# Altium integrated library Weidmueller_OMNIMATE_Signal.IntLib: 2550 symbols (part 4 of 45)
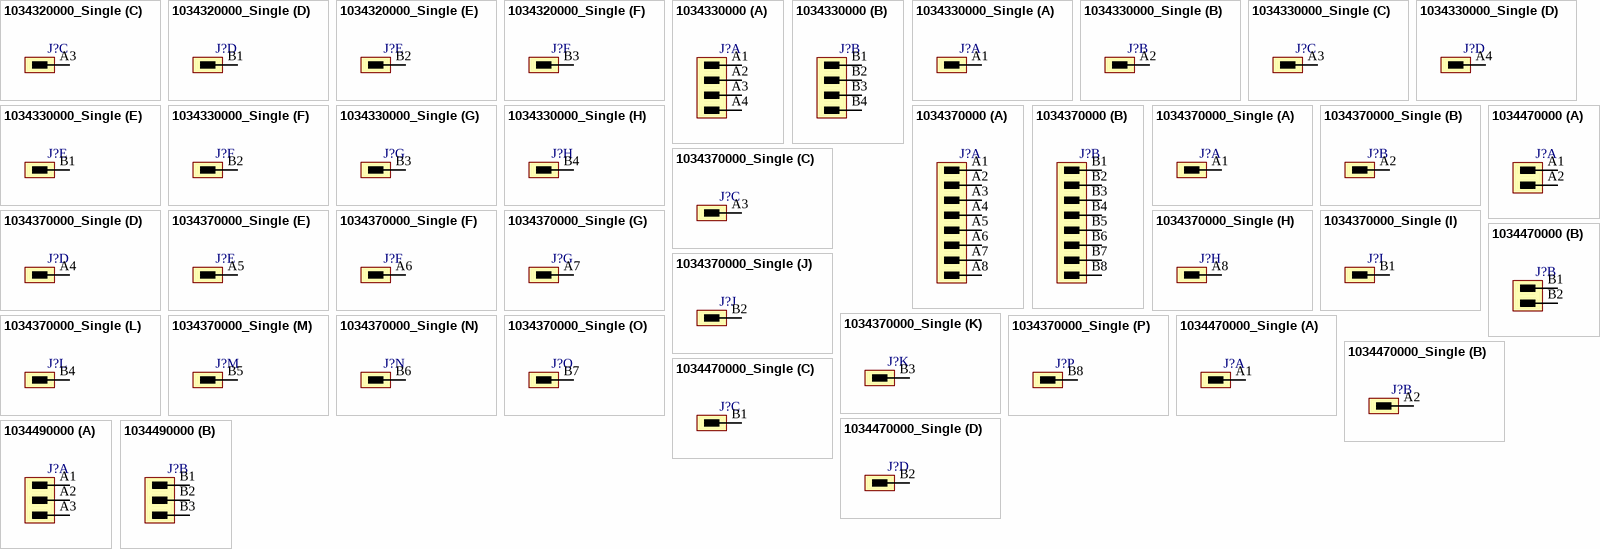
[diagram p214: symbols 1034320000_Single to 1034490000]

## 1034330000_Single
designator J?
OMNIMATE Signal - series BC/SC 3.81; PartNumber: 1034330000; Manufacturer: Weidmueller; Short_text_for_material: SCDV-THR 3.81/08/90F 1.5SN BK BX; Side_termination_characteristic: Flange; Mounting_onto_the_PCB: Reflow solder connection; Pitch_mm: 3.81 mm; Pitch_inch: 0.15 inch; No_of_poles: 8; Outgoing_elbow: 90°; Solder_pin_length_mm: 1.5 mm; Contact_surface: tinned; Insulating_material: LCP GF; UL_94_flammability_rating: V-0; Rated_voltage_for_surge_voltage_class_pollution_degree_II_2: 320 V; Rated_current_min_no_of_poles_TU_20_deg_C: 17.5 A; Rated_voltage_use_group_B_UL_1059: 300 V; Rated_current_use_group_B_UL_1059: 10 A; PackageReference: SCDV_THR_3_81_90F_08; Colour: Black; Packaging: Box; Qty: 50 PCS; Revision: V1; ComponentLink1Description: Manufacturer URL; ComponentLink1URL: http://www.weidmueller.com/; ComponentLink2Description: URL Link1; ComponentLink2URL: http://catalog.weidmueller.com/catalog/Start.do?localeId=en&ObjectID=1034330000
footprint SCDV_THR_3_81_90F_08 (OMNIMATE Signal - Serie BC/SC 3.81  SCDV-THR 3.81/08/90F 3.2)
part A pins: A1
part B pins: A2
part C pins: A3
part D pins: A4
part E pins: B1
part F pins: B2
part G pins: B3
part H pins: B4

## 1034370000
designator J?
OMNIMATE Signal - series BC/SC 3.81; PartNumber: 1034370000; Manufacturer: Weidmueller; Short_text_for_material: SCDV-THR 3.81/16/90F 1.5SN BK BX; Side_termination_characteristic: Flange; Mounting_onto_the_PCB: Reflow solder connection; Pitch_mm: 3.81 mm; Pitch_inch: 0.15 inch; No_of_poles: 16; Outgoing_elbow: 90°; Solder_pin_length_mm: 1.5 mm; Contact_surface: tinned; Insulating_material: LCP GF; UL_94_flammability_rating: V-0; Rated_voltage_for_surge_voltage_class_pollution_degree_II_2: 320 V; Rated_current_min_no_of_poles_TU_20_deg_C: 17.5 A; Rated_voltage_use_group_B_UL_1059: 300 V; Rated_current_use_group_B_UL_1059: 10 A; PackageReference: SCDV_THR_3_81_90F_16; Colour: Black; Packaging: Box; Qty: 50 PCS; Revision: V1; ComponentLink1Description: Manufacturer URL; ComponentLink1URL: http://www.weidmueller.com/; ComponentLink2Description: URL Link1; ComponentLink2URL: http://catalog.weidmueller.com/catalog/Start.do?localeId=en&ObjectID=1034370000
footprint SCDV_THR_3_81_90F_16 (OMNIMATE Signal - Serie BC/SC 3.81  SCDV-THR 3.81/16/90F 3.2)
part A pins: A1, A2, A3, A4, A5, A6, A7, A8
part B pins: B1, B2, B3, B4, B5, B6, B7, B8

## 1034370000_Single
designator J?
OMNIMATE Signal - series BC/SC 3.81; PartNumber: 1034370000; Manufacturer: Weidmueller; Short_text_for_material: SCDV-THR 3.81/16/90F 1.5SN BK BX; Side_termination_characteristic: Flange; Mounting_onto_the_PCB: Reflow solder connection; Pitch_mm: 3.81 mm; Pitch_inch: 0.15 inch; No_of_poles: 16; Outgoing_elbow: 90°; Solder_pin_length_mm: 1.5 mm; Contact_surface: tinned; Insulating_material: LCP GF; UL_94_flammability_rating: V-0; Rated_voltage_for_surge_voltage_class_pollution_degree_II_2: 320 V; Rated_current_min_no_of_poles_TU_20_deg_C: 17.5 A; Rated_voltage_use_group_B_UL_1059: 300 V; Rated_current_use_group_B_UL_1059: 10 A; PackageReference: SCDV_THR_3_81_90F_16; Colour: Black; Packaging: Box; Qty: 50 PCS; Revision: V1; ComponentLink1Description: Manufacturer URL; ComponentLink1URL: http://www.weidmueller.com/; ComponentLink2Description: URL Link1; ComponentLink2URL: http://catalog.weidmueller.com/catalog/Start.do?localeId=en&ObjectID=1034370000
footprint SCDV_THR_3_81_90F_16 (OMNIMATE Signal - Serie BC/SC 3.81  SCDV-THR 3.81/16/90F 3.2)
part A pins: A1
part B pins: A2
part C pins: A3
part D pins: A4
part E pins: A5
part F pins: A6
part G pins: A7
part H pins: A8
part I pins: B1
part J pins: B2
part K pins: B3
part L pins: B4
part M pins: B5
part N pins: B6
part O pins: B7
part P pins: B8

## 1034470000
designator J?
OMNIMATE Signal - series BC/SC 3.81; PartNumber: 1034470000; Manufacturer: Weidmueller; Short_text_for_material: SCDV 3.81/04/180G 3.2SN OR BX; Side_termination_characteristic: closed side; Mounting_onto_the_PCB: Solder connection; Pitch_mm: 3.81 mm; Pitch_inch: 0.15 inch; No_of_poles: 4; Outgoing_elbow: 180°; Solder_pin_length_mm: 3.2 mm; Contact_material: Cu-Leg; Contact_surface: tinned; Insulating_material: PA GF; UL_94_flammability_rating: V-0; Rated_voltage_for_surge_voltage_class_pollution_degree_II_2: 320 V; Rated_voltage_use_group_B_UL_1059: 300 V; Rated_current_use_group_B_UL_1059: 10 A; PackageReference: SCDV_3_81_180G_04; Colour: Orange; Packaging: Box; Qty: 50 PCS; Revision: V1; ComponentLink1Description: Manufacturer URL; ComponentLink1URL: http://www.weidmueller.com/; ComponentLink2Description: URL Link1; ComponentLink2URL: http://catalog.weidmueller.com/catalog/Start.do?localeId=en&ObjectID=1034470000
footprint SCDV_3_81_180G_04 (OMNIMATE Signal - Serie BC/SC 3.81  SCDV 3.81/04/180G 3.2)
part A pins: A1, A2
part B pins: B1, B2

## 1034470000_Single
designator J?
OMNIMATE Signal - series BC/SC 3.81; PartNumber: 1034470000; Manufacturer: Weidmueller; Short_text_for_material: SCDV 3.81/04/180G 3.2SN OR BX; Side_termination_characteristic: closed side; Mounting_onto_the_PCB: Solder connection; Pitch_mm: 3.81 mm; Pitch_inch: 0.15 inch; No_of_poles: 4; Outgoing_elbow: 180°; Solder_pin_length_mm: 3.2 mm; Contact_material: Cu-Leg; Contact_surface: tinned; Insulating_material: PA GF; UL_94_flammability_rating: V-0; Rated_voltage_for_surge_voltage_class_pollution_degree_II_2: 320 V; Rated_voltage_use_group_B_UL_1059: 300 V; Rated_current_use_group_B_UL_1059: 10 A; PackageReference: SCDV_3_81_180G_04; Colour: Orange; Packaging: Box; Qty: 50 PCS; Revision: V1; ComponentLink1Description: Manufacturer URL; ComponentLink1URL: http://www.weidmueller.com/; ComponentLink2Description: URL Link1; ComponentLink2URL: http://catalog.weidmueller.com/catalog/Start.do?localeId=en&ObjectID=1034470000
footprint SCDV_3_81_180G_04 (OMNIMATE Signal - Serie BC/SC 3.81  SCDV 3.81/04/180G 3.2)
part A pins: A1
part B pins: A2
part C pins: B1
part D pins: B2

## 1034490000
designator J?
OMNIMATE Signal - series BC/SC 3.81; PartNumber: 1034490000; Manufacturer: Weidmueller; Short_text_for_material: SCDV 3.81/06/180G 3.2SN OR BX; Side_termination_characteristic: closed side; Mounting_onto_the_PCB: Solder connection; Pitch_mm: 3.81 mm; Pitch_inch: 0.15 inch; No_of_poles: 6; Outgoing_elbow: 180°; Solder_pin_length_mm: 3.2 mm; Contact_material: Cu-Leg; Contact_surface: tinned; Insulating_material: PA GF; UL_94_flammability_rating: V-0; Rated_voltage_for_surge_voltage_class_pollution_degree_II_2: 320 V; Rated_voltage_use_group_B_UL_1059: 300 V; Rated_current_use_group_B_UL_1059: 10 A; PackageReference: SCDV_3_81_180G_06; Colour: Orange; Packaging: Box; Qty: 50 PCS; Revision: V1; ComponentLink1Description: Manufacturer URL; ComponentLink1URL: http://www.weidmueller.com/; ComponentLink2Description: URL Link1; ComponentLink2URL: http://catalog.weidmueller.com/catalog/Start.do?localeId=en&ObjectID=1034490000
footprint SCDV_3_81_180G_06 (OMNIMATE Signal - Serie BC/SC 3.81  SCDV 3.81/06/180G 3.2)
part A pins: A1, A2, A3
part B pins: B1, B2, B3

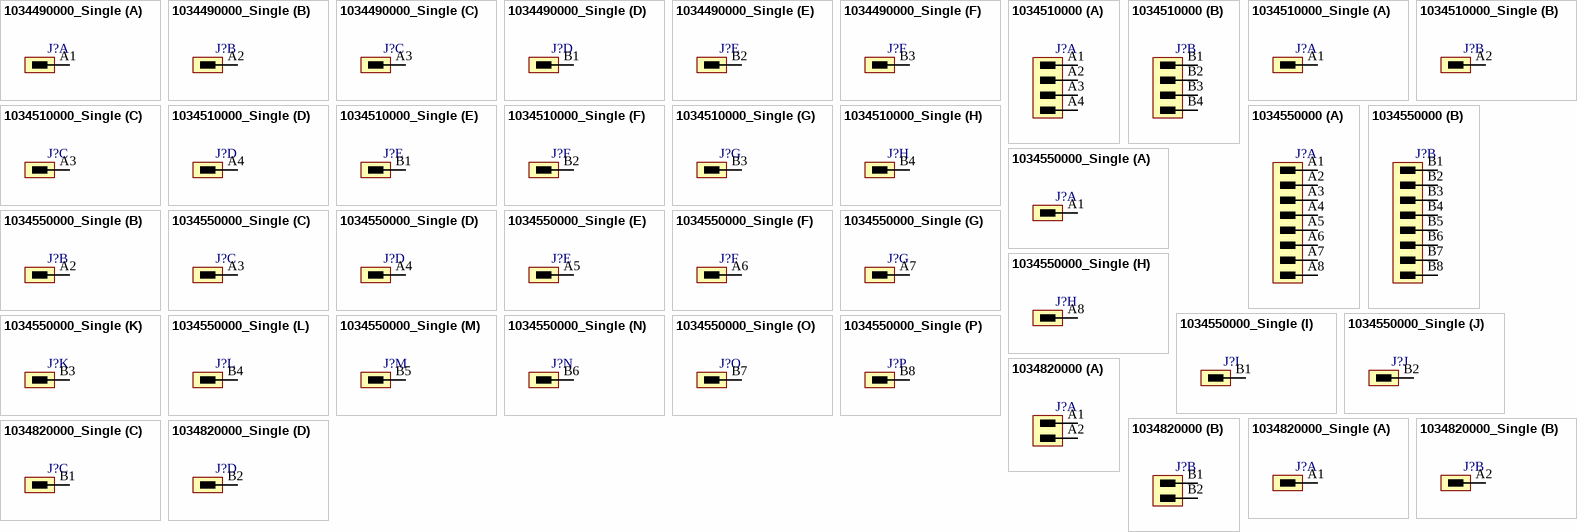
[diagram p20: symbols 1034490000_Single to 1034820000_Single]

## 1034490000_Single
designator J?
OMNIMATE Signal - series BC/SC 3.81; PartNumber: 1034490000; Manufacturer: Weidmueller; Short_text_for_material: SCDV 3.81/06/180G 3.2SN OR BX; Side_termination_characteristic: closed side; Mounting_onto_the_PCB: Solder connection; Pitch_mm: 3.81 mm; Pitch_inch: 0.15 inch; No_of_poles: 6; Outgoing_elbow: 180°; Solder_pin_length_mm: 3.2 mm; Contact_material: Cu-Leg; Contact_surface: tinned; Insulating_material: PA GF; UL_94_flammability_rating: V-0; Rated_voltage_for_surge_voltage_class_pollution_degree_II_2: 320 V; Rated_voltage_use_group_B_UL_1059: 300 V; Rated_current_use_group_B_UL_1059: 10 A; PackageReference: SCDV_3_81_180G_06; Colour: Orange; Packaging: Box; Qty: 50 PCS; Revision: V1; ComponentLink1Description: Manufacturer URL; ComponentLink1URL: http://www.weidmueller.com/; ComponentLink2Description: URL Link1; ComponentLink2URL: http://catalog.weidmueller.com/catalog/Start.do?localeId=en&ObjectID=1034490000
footprint SCDV_3_81_180G_06 (OMNIMATE Signal - Serie BC/SC 3.81  SCDV 3.81/06/180G 3.2)
part A pins: A1
part B pins: A2
part C pins: A3
part D pins: B1
part E pins: B2
part F pins: B3

## 1034510000
designator J?
OMNIMATE Signal - series BC/SC 3.81; PartNumber: 1034510000; Manufacturer: Weidmueller; Short_text_for_material: SCDV 3.81/08/180G 3.2SN OR BX; Side_termination_characteristic: closed side; Mounting_onto_the_PCB: Solder connection; Pitch_mm: 3.81 mm; Pitch_inch: 0.15 inch; No_of_poles: 8; Outgoing_elbow: 180°; Solder_pin_length_mm: 3.2 mm; Contact_material: Cu-Leg; Contact_surface: tinned; Insulating_material: PA GF; UL_94_flammability_rating: V-0; Rated_voltage_for_surge_voltage_class_pollution_degree_II_2: 320 V; Rated_voltage_use_group_B_UL_1059: 300 V; Rated_current_use_group_B_UL_1059: 10 A; PackageReference: SCDV_3_81_180G_08; Colour: Orange; Packaging: Box; Qty: 50 PCS; Revision: V1; ComponentLink1Description: Manufacturer URL; ComponentLink1URL: http://www.weidmueller.com/; ComponentLink2Description: URL Link1; ComponentLink2URL: http://catalog.weidmueller.com/catalog/Start.do?localeId=en&ObjectID=1034510000
footprint SCDV_3_81_180G_08 (OMNIMATE Signal - Serie BC/SC 3.81  SCDV 3.81/08/180G 3.2)
part A pins: A1, A2, A3, A4
part B pins: B1, B2, B3, B4

## 1034510000_Single
designator J?
OMNIMATE Signal - series BC/SC 3.81; PartNumber: 1034510000; Manufacturer: Weidmueller; Short_text_for_material: SCDV 3.81/08/180G 3.2SN OR BX; Side_termination_characteristic: closed side; Mounting_onto_the_PCB: Solder connection; Pitch_mm: 3.81 mm; Pitch_inch: 0.15 inch; No_of_poles: 8; Outgoing_elbow: 180°; Solder_pin_length_mm: 3.2 mm; Contact_material: Cu-Leg; Contact_surface: tinned; Insulating_material: PA GF; UL_94_flammability_rating: V-0; Rated_voltage_for_surge_voltage_class_pollution_degree_II_2: 320 V; Rated_voltage_use_group_B_UL_1059: 300 V; Rated_current_use_group_B_UL_1059: 10 A; PackageReference: SCDV_3_81_180G_08; Colour: Orange; Packaging: Box; Qty: 50 PCS; Revision: V1; ComponentLink1Description: Manufacturer URL; ComponentLink1URL: http://www.weidmueller.com/; ComponentLink2Description: URL Link1; ComponentLink2URL: http://catalog.weidmueller.com/catalog/Start.do?localeId=en&ObjectID=1034510000
footprint SCDV_3_81_180G_08 (OMNIMATE Signal - Serie BC/SC 3.81  SCDV 3.81/08/180G 3.2)
part A pins: A1
part B pins: A2
part C pins: A3
part D pins: A4
part E pins: B1
part F pins: B2
part G pins: B3
part H pins: B4

## 1034550000
designator J?
OMNIMATE Signal - series BC/SC 3.81; PartNumber: 1034550000; Manufacturer: Weidmueller; Short_text_for_material: SCDV 3.81/16/180G 3.2SN OR BX; Side_termination_characteristic: closed side; Mounting_onto_the_PCB: Solder connection; Pitch_mm: 3.81 mm; Pitch_inch: 0.15 inch; No_of_poles: 16; Outgoing_elbow: 180°; Solder_pin_length_mm: 3.2 mm; Contact_material: Cu-Leg; Contact_surface: tinned; Insulating_material: PA GF; UL_94_flammability_rating: V-0; Rated_voltage_for_surge_voltage_class_pollution_degree_II_2: 320 V; Rated_voltage_use_group_B_UL_1059: 300 V; Rated_current_use_group_B_UL_1059: 10 A; PackageReference: SCDV_3_81_180G_16; Colour: Orange; Packaging: Box; Qty: 50 PCS; Revision: V1; ComponentLink1Description: Manufacturer URL; ComponentLink1URL: http://www.weidmueller.com/; ComponentLink2Description: URL Link1; ComponentLink2URL: http://catalog.weidmueller.com/catalog/Start.do?localeId=en&ObjectID=1034550000
footprint SCDV_3_81_180G_16 (OMNIMATE Signal - Serie BC/SC 3.81  SCDV 3.81/16/180G 3.2)
part A pins: A1, A2, A3, A4, A5, A6, A7, A8
part B pins: B1, B2, B3, B4, B5, B6, B7, B8

## 1034550000_Single
designator J?
OMNIMATE Signal - series BC/SC 3.81; PartNumber: 1034550000; Manufacturer: Weidmueller; Short_text_for_material: SCDV 3.81/16/180G 3.2SN OR BX; Side_termination_characteristic: closed side; Mounting_onto_the_PCB: Solder connection; Pitch_mm: 3.81 mm; Pitch_inch: 0.15 inch; No_of_poles: 16; Outgoing_elbow: 180°; Solder_pin_length_mm: 3.2 mm; Contact_material: Cu-Leg; Contact_surface: tinned; Insulating_material: PA GF; UL_94_flammability_rating: V-0; Rated_voltage_for_surge_voltage_class_pollution_degree_II_2: 320 V; Rated_voltage_use_group_B_UL_1059: 300 V; Rated_current_use_group_B_UL_1059: 10 A; PackageReference: SCDV_3_81_180G_16; Colour: Orange; Packaging: Box; Qty: 50 PCS; Revision: V1; ComponentLink1Description: Manufacturer URL; ComponentLink1URL: http://www.weidmueller.com/; ComponentLink2Description: URL Link1; ComponentLink2URL: http://catalog.weidmueller.com/catalog/Start.do?localeId=en&ObjectID=1034550000
footprint SCDV_3_81_180G_16 (OMNIMATE Signal - Serie BC/SC 3.81  SCDV 3.81/16/180G 3.2)
part A pins: A1
part B pins: A2
part C pins: A3
part D pins: A4
part E pins: A5
part F pins: A6
part G pins: A7
part H pins: A8
part I pins: B1
part J pins: B2
part K pins: B3
part L pins: B4
part M pins: B5
part N pins: B6
part O pins: B7
part P pins: B8

## 1034820000
designator J?
OMNIMATE Signal - series BC/SC 3.81; PartNumber: 1034820000; Manufacturer: Weidmueller; Short_text_for_material: SCDV 3.81/04/180G 3.2SN BK BX; Side_termination_characteristic: closed side; Mounting_onto_the_PCB: Solder connection; Pitch_mm: 3.81 mm; Pitch_inch: 0.15 inch; No_of_poles: 4; Outgoing_elbow: 180°; Solder_pin_length_mm: 3.2 mm; Contact_surface: tinned; Insulating_material: PA GF; UL_94_flammability_rating: V-0; Rated_voltage_for_surge_voltage_class_pollution_degree_II_2: 320 V; Rated_current_min_no_of_poles_TU_20_deg_C: 17.5 A; Rated_voltage_use_group_B_UL_1059: 300 V; Rated_current_use_group_B_UL_1059: 10 A; PackageReference: SCDV_3_81_180G_04; Colour: Black; Packaging: Box; Qty: 50 PCS; Revision: V1; ComponentLink1Description: Manufacturer URL; ComponentLink1URL: http://www.weidmueller.com/; ComponentLink2Description: URL Link1; ComponentLink2URL: http://catalog.weidmueller.com/catalog/Start.do?localeId=en&ObjectID=1034820000
footprint SCDV_3_81_180G_04 (OMNIMATE Signal - Serie BC/SC 3.81  SCDV 3.81/04/180G 3.2)
part A pins: A1, A2
part B pins: B1, B2

## 1034820000_Single
designator J?
OMNIMATE Signal - series BC/SC 3.81; PartNumber: 1034820000; Manufacturer: Weidmueller; Short_text_for_material: SCDV 3.81/04/180G 3.2SN BK BX; Side_termination_characteristic: closed side; Mounting_onto_the_PCB: Solder connection; Pitch_mm: 3.81 mm; Pitch_inch: 0.15 inch; No_of_poles: 4; Outgoing_elbow: 180°; Solder_pin_length_mm: 3.2 mm; Contact_surface: tinned; Insulating_material: PA GF; UL_94_flammability_rating: V-0; Rated_voltage_for_surge_voltage_class_pollution_degree_II_2: 320 V; Rated_current_min_no_of_poles_TU_20_deg_C: 17.5 A; Rated_voltage_use_group_B_UL_1059: 300 V; Rated_current_use_group_B_UL_1059: 10 A; PackageReference: SCDV_3_81_180G_04; Colour: Black; Packaging: Box; Qty: 50 PCS; Revision: V1; ComponentLink1Description: Manufacturer URL; ComponentLink1URL: http://www.weidmueller.com/; ComponentLink2Description: URL Link1; ComponentLink2URL: http://catalog.weidmueller.com/catalog/Start.do?localeId=en&ObjectID=1034820000
footprint SCDV_3_81_180G_04 (OMNIMATE Signal - Serie BC/SC 3.81  SCDV 3.81/04/180G 3.2)
part A pins: A1
part B pins: A2
part C pins: B1
part D pins: B2

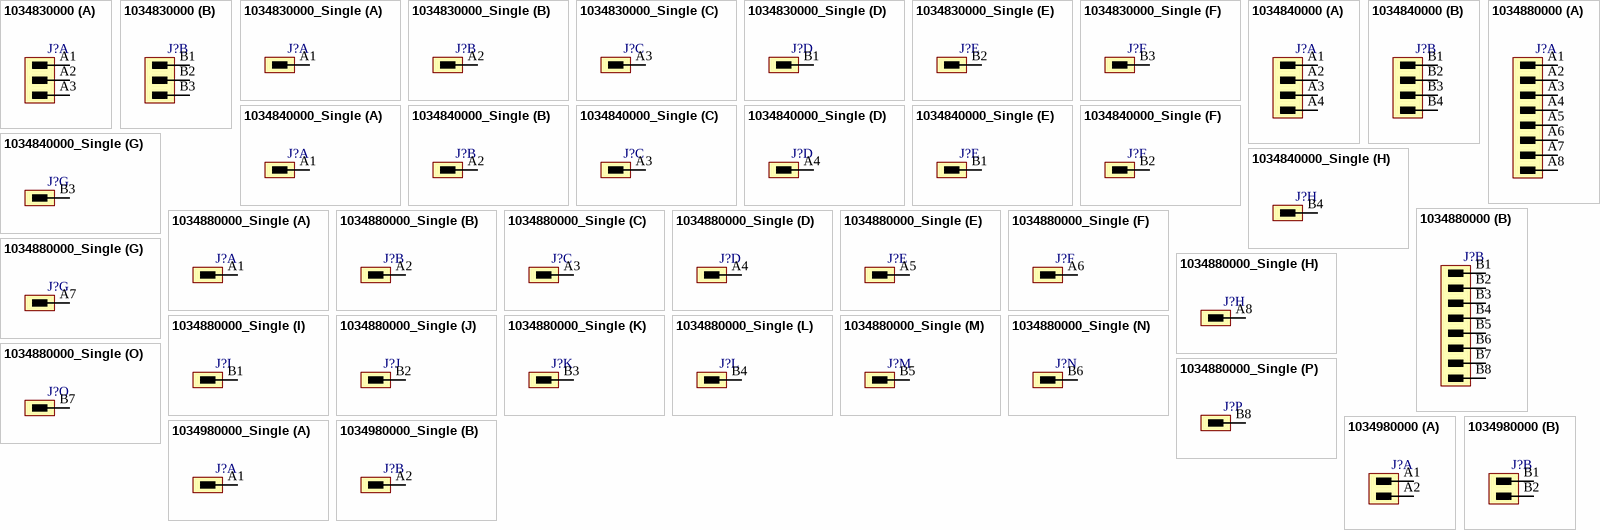
[diagram p21: symbols 1034830000 to 1034980000_Single]

## 1034830000
designator J?
OMNIMATE Signal - series BC/SC 3.81; PartNumber: 1034830000; Manufacturer: Weidmueller; Short_text_for_material: SCDV 3.81/06/180G 3.2SN BK BX; Side_termination_characteristic: closed side; Mounting_onto_the_PCB: Solder connection; Pitch_mm: 3.81 mm; Pitch_inch: 0.15 inch; No_of_poles: 6; Outgoing_elbow: 180°; Solder_pin_length_mm: 3.2 mm; Contact_surface: tinned; Insulating_material: PA GF; UL_94_flammability_rating: V-0; Rated_voltage_for_surge_voltage_class_pollution_degree_II_2: 320 V; Rated_current_min_no_of_poles_TU_20_deg_C: 17.5 A; Rated_voltage_use_group_B_UL_1059: 300 V; Rated_current_use_group_B_UL_1059: 10 A; PackageReference: SCDV_3_81_180G_06; Colour: Black; Packaging: Box; Qty: 50 PCS; Revision: V1; ComponentLink1Description: Manufacturer URL; ComponentLink1URL: http://www.weidmueller.com/; ComponentLink2Description: URL Link1; ComponentLink2URL: http://catalog.weidmueller.com/catalog/Start.do?localeId=en&ObjectID=1034830000
footprint SCDV_3_81_180G_06 (OMNIMATE Signal - Serie BC/SC 3.81  SCDV 3.81/06/180G 3.2)
part A pins: A1, A2, A3
part B pins: B1, B2, B3

## 1034830000_Single
designator J?
OMNIMATE Signal - series BC/SC 3.81; PartNumber: 1034830000; Manufacturer: Weidmueller; Short_text_for_material: SCDV 3.81/06/180G 3.2SN BK BX; Side_termination_characteristic: closed side; Mounting_onto_the_PCB: Solder connection; Pitch_mm: 3.81 mm; Pitch_inch: 0.15 inch; No_of_poles: 6; Outgoing_elbow: 180°; Solder_pin_length_mm: 3.2 mm; Contact_surface: tinned; Insulating_material: PA GF; UL_94_flammability_rating: V-0; Rated_voltage_for_surge_voltage_class_pollution_degree_II_2: 320 V; Rated_current_min_no_of_poles_TU_20_deg_C: 17.5 A; Rated_voltage_use_group_B_UL_1059: 300 V; Rated_current_use_group_B_UL_1059: 10 A; PackageReference: SCDV_3_81_180G_06; Colour: Black; Packaging: Box; Qty: 50 PCS; Revision: V1; ComponentLink1Description: Manufacturer URL; ComponentLink1URL: http://www.weidmueller.com/; ComponentLink2Description: URL Link1; ComponentLink2URL: http://catalog.weidmueller.com/catalog/Start.do?localeId=en&ObjectID=1034830000
footprint SCDV_3_81_180G_06 (OMNIMATE Signal - Serie BC/SC 3.81  SCDV 3.81/06/180G 3.2)
part A pins: A1
part B pins: A2
part C pins: A3
part D pins: B1
part E pins: B2
part F pins: B3

## 1034840000
designator J?
OMNIMATE Signal - series BC/SC 3.81; PartNumber: 1034840000; Manufacturer: Weidmueller; Short_text_for_material: SCDV 3.81/08/180G 3.2SN BK BX; Side_termination_characteristic: closed side; Mounting_onto_the_PCB: Solder connection; Pitch_mm: 3.81 mm; Pitch_inch: 0.15 inch; No_of_poles: 8; Outgoing_elbow: 180°; Solder_pin_length_mm: 3.2 mm; Contact_surface: tinned; Insulating_material: PA GF; UL_94_flammability_rating: V-0; Rated_voltage_for_surge_voltage_class_pollution_degree_II_2: 320 V; Rated_current_min_no_of_poles_TU_20_deg_C: 17.5 A; Rated_voltage_use_group_B_UL_1059: 300 V; Rated_current_use_group_B_UL_1059: 10 A; PackageReference: SCDV_3_81_180G_08; Colour: Black; Packaging: Box; Qty: 50 PCS; Revision: V1; ComponentLink1Description: Manufacturer URL; ComponentLink1URL: http://www.weidmueller.com/; ComponentLink2Description: URL Link1; ComponentLink2URL: http://catalog.weidmueller.com/catalog/Start.do?localeId=en&ObjectID=1034840000
footprint SCDV_3_81_180G_08 (OMNIMATE Signal - Serie BC/SC 3.81  SCDV 3.81/08/180G 3.2)
part A pins: A1, A2, A3, A4
part B pins: B1, B2, B3, B4

## 1034840000_Single
designator J?
OMNIMATE Signal - series BC/SC 3.81; PartNumber: 1034840000; Manufacturer: Weidmueller; Short_text_for_material: SCDV 3.81/08/180G 3.2SN BK BX; Side_termination_characteristic: closed side; Mounting_onto_the_PCB: Solder connection; Pitch_mm: 3.81 mm; Pitch_inch: 0.15 inch; No_of_poles: 8; Outgoing_elbow: 180°; Solder_pin_length_mm: 3.2 mm; Contact_surface: tinned; Insulating_material: PA GF; UL_94_flammability_rating: V-0; Rated_voltage_for_surge_voltage_class_pollution_degree_II_2: 320 V; Rated_current_min_no_of_poles_TU_20_deg_C: 17.5 A; Rated_voltage_use_group_B_UL_1059: 300 V; Rated_current_use_group_B_UL_1059: 10 A; PackageReference: SCDV_3_81_180G_08; Colour: Black; Packaging: Box; Qty: 50 PCS; Revision: V1; ComponentLink1Description: Manufacturer URL; ComponentLink1URL: http://www.weidmueller.com/; ComponentLink2Description: URL Link1; ComponentLink2URL: http://catalog.weidmueller.com/catalog/Start.do?localeId=en&ObjectID=1034840000
footprint SCDV_3_81_180G_08 (OMNIMATE Signal - Serie BC/SC 3.81  SCDV 3.81/08/180G 3.2)
part A pins: A1
part B pins: A2
part C pins: A3
part D pins: A4
part E pins: B1
part F pins: B2
part G pins: B3
part H pins: B4

## 1034880000
designator J?
OMNIMATE Signal - series BC/SC 3.81; PartNumber: 1034880000; Manufacturer: Weidmueller; Short_text_for_material: SCDV 3.81/16/180G 3.2SN BK BX; Side_termination_characteristic: closed side; Mounting_onto_the_PCB: Solder connection; Pitch_mm: 3.81 mm; Pitch_inch: 0.15 inch; No_of_poles: 16; Outgoing_elbow: 180°; Solder_pin_length_mm: 3.2 mm; Contact_surface: tinned; Insulating_material: PA GF; UL_94_flammability_rating: V-0; Rated_voltage_for_surge_voltage_class_pollution_degree_II_2: 320 V; Rated_current_min_no_of_poles_TU_20_deg_C: 17.5 A; Rated_voltage_use_group_B_UL_1059: 300 V; Rated_current_use_group_B_UL_1059: 10 A; PackageReference: SCDV_3_81_180G_16; Colour: Black; Packaging: Box; Qty: 50 PCS; Revision: V1; ComponentLink1Description: Manufacturer URL; ComponentLink1URL: http://www.weidmueller.com/; ComponentLink2Description: URL Link1; ComponentLink2URL: http://catalog.weidmueller.com/catalog/Start.do?localeId=en&ObjectID=1034880000
footprint SCDV_3_81_180G_16 (OMNIMATE Signal - Serie BC/SC 3.81  SCDV 3.81/16/180G 3.2)
part A pins: A1, A2, A3, A4, A5, A6, A7, A8
part B pins: B1, B2, B3, B4, B5, B6, B7, B8

## 1034880000_Single
designator J?
OMNIMATE Signal - series BC/SC 3.81; PartNumber: 1034880000; Manufacturer: Weidmueller; Short_text_for_material: SCDV 3.81/16/180G 3.2SN BK BX; Side_termination_characteristic: closed side; Mounting_onto_the_PCB: Solder connection; Pitch_mm: 3.81 mm; Pitch_inch: 0.15 inch; No_of_poles: 16; Outgoing_elbow: 180°; Solder_pin_length_mm: 3.2 mm; Contact_surface: tinned; Insulating_material: PA GF; UL_94_flammability_rating: V-0; Rated_voltage_for_surge_voltage_class_pollution_degree_II_2: 320 V; Rated_current_min_no_of_poles_TU_20_deg_C: 17.5 A; Rated_voltage_use_group_B_UL_1059: 300 V; Rated_current_use_group_B_UL_1059: 10 A; PackageReference: SCDV_3_81_180G_16; Colour: Black; Packaging: Box; Qty: 50 PCS; Revision: V1; ComponentLink1Description: Manufacturer URL; ComponentLink1URL: http://www.weidmueller.com/; ComponentLink2Description: URL Link1; ComponentLink2URL: http://catalog.weidmueller.com/catalog/Start.do?localeId=en&ObjectID=1034880000
footprint SCDV_3_81_180G_16 (OMNIMATE Signal - Serie BC/SC 3.81  SCDV 3.81/16/180G 3.2)
part A pins: A1
part B pins: A2
part C pins: A3
part D pins: A4
part E pins: A5
part F pins: A6
part G pins: A7
part H pins: A8
part I pins: B1
part J pins: B2
part K pins: B3
part L pins: B4
part M pins: B5
part N pins: B6
part O pins: B7
part P pins: B8

## 1034980000
designator J?
OMNIMATE Signal - series BC/SC 3.81; PartNumber: 1034980000; Manufacturer: Weidmueller; Short_text_for_material: SCDV 3.81/04/180F 3.2SN OR BX; Side_termination_characteristic: Flange; Mounting_onto_the_PCB: Solder connection; Pitch_mm: 3.81 mm; Pitch_inch: 0.15 inch; No_of_poles: 4; Outgoing_elbow: 180°; Solder_pin_length_mm: 3.2 mm; Contact_material: Cu-Leg; Contact_surface: tinned; Insulating_material: PA GF; UL_94_flammability_rating: V-0; Rated_voltage_for_surge_voltage_class_pollution_degree_II_2: 320 V; Rated_voltage_use_group_B_UL_1059: 300 V; Rated_current_use_group_B_UL_1059: 10 A; PackageReference: SCDV_3_81_180F_04; Colour: Orange; Packaging: Box; Qty: 50 PCS; Revision: V1; ComponentLink1Description: Manufacturer URL; ComponentLink1URL: http://www.weidmueller.com/; ComponentLink2Description: URL Link1; ComponentLink2URL: http://catalog.weidmueller.com/catalog/Start.do?localeId=en&ObjectID=1034980000
footprint SCDV_3_81_180F_04 (OMNIMATE Signal - Serie BC/SC 3.81  SCDV 3.81/04/180F 3.2)
part A pins: A1, A2
part B pins: B1, B2

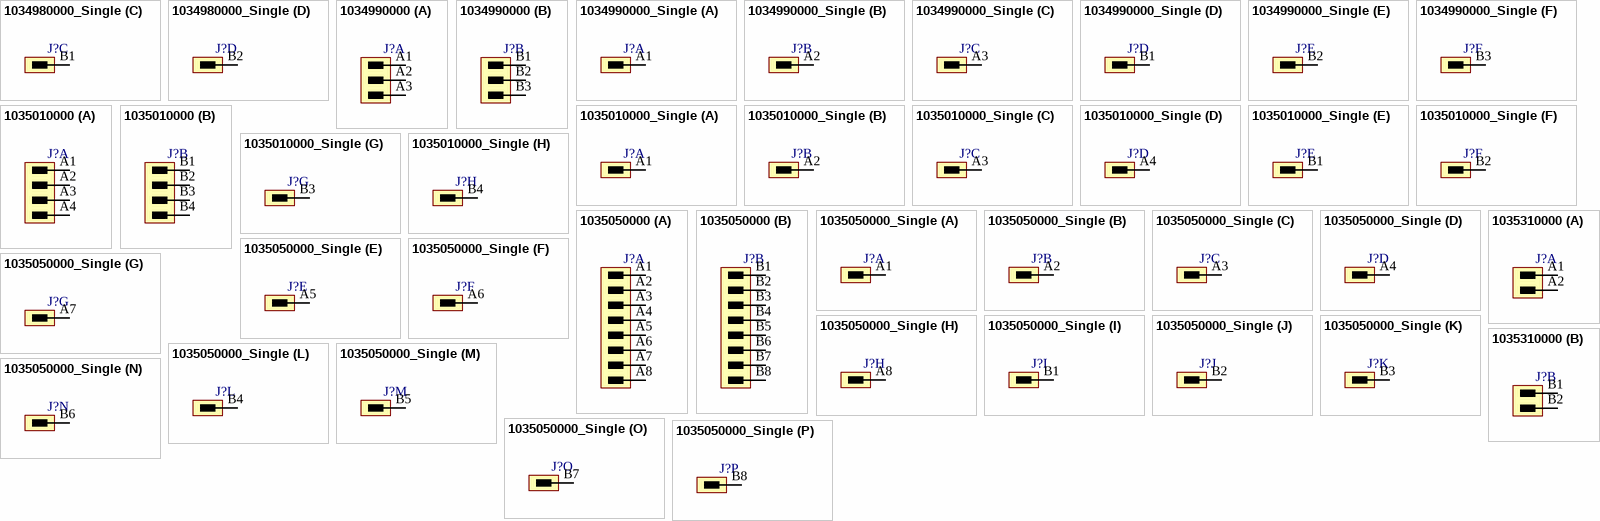
[diagram p22: symbols 1034980000_Single to 1035310000]

## 1034980000_Single
designator J?
OMNIMATE Signal - series BC/SC 3.81; PartNumber: 1034980000; Manufacturer: Weidmueller; Short_text_for_material: SCDV 3.81/04/180F 3.2SN OR BX; Side_termination_characteristic: Flange; Mounting_onto_the_PCB: Solder connection; Pitch_mm: 3.81 mm; Pitch_inch: 0.15 inch; No_of_poles: 4; Outgoing_elbow: 180°; Solder_pin_length_mm: 3.2 mm; Contact_material: Cu-Leg; Contact_surface: tinned; Insulating_material: PA GF; UL_94_flammability_rating: V-0; Rated_voltage_for_surge_voltage_class_pollution_degree_II_2: 320 V; Rated_voltage_use_group_B_UL_1059: 300 V; Rated_current_use_group_B_UL_1059: 10 A; PackageReference: SCDV_3_81_180F_04; Colour: Orange; Packaging: Box; Qty: 50 PCS; Revision: V1; ComponentLink1Description: Manufacturer URL; ComponentLink1URL: http://www.weidmueller.com/; ComponentLink2Description: URL Link1; ComponentLink2URL: http://catalog.weidmueller.com/catalog/Start.do?localeId=en&ObjectID=1034980000
footprint SCDV_3_81_180F_04 (OMNIMATE Signal - Serie BC/SC 3.81  SCDV 3.81/04/180F 3.2)
part A pins: A1
part B pins: A2
part C pins: B1
part D pins: B2

## 1034990000
designator J?
OMNIMATE Signal - series BC/SC 3.81; PartNumber: 1034990000; Manufacturer: Weidmueller; Short_text_for_material: SCDV 3.81/06/180F 3.2SN OR BX; Side_termination_characteristic: Flange; Mounting_onto_the_PCB: Solder connection; Pitch_mm: 3.81 mm; Pitch_inch: 0.15 inch; No_of_poles: 6; Outgoing_elbow: 180°; Solder_pin_length_mm: 3.2 mm; Contact_material: Cu-Leg; Contact_surface: tinned; Insulating_material: PA GF; UL_94_flammability_rating: V-0; Rated_voltage_for_surge_voltage_class_pollution_degree_II_2: 320 V; Rated_voltage_use_group_B_UL_1059: 300 V; Rated_current_use_group_B_UL_1059: 10 A; PackageReference: SCDV_3_81_180F_06; Colour: Orange; Packaging: Box; Qty: 50 PCS; Revision: V1; ComponentLink1Description: Manufacturer URL; ComponentLink1URL: http://www.weidmueller.com/; ComponentLink2Description: URL Link1; ComponentLink2URL: http://catalog.weidmueller.com/catalog/Start.do?localeId=en&ObjectID=1034990000
footprint SCDV_3_81_180F_06 (OMNIMATE Signal - Serie BC/SC 3.81  SCDV 3.81/06/180F 3.2)
part A pins: A1, A2, A3
part B pins: B1, B2, B3

## 1034990000_Single
designator J?
OMNIMATE Signal - series BC/SC 3.81; PartNumber: 1034990000; Manufacturer: Weidmueller; Short_text_for_material: SCDV 3.81/06/180F 3.2SN OR BX; Side_termination_characteristic: Flange; Mounting_onto_the_PCB: Solder connection; Pitch_mm: 3.81 mm; Pitch_inch: 0.15 inch; No_of_poles: 6; Outgoing_elbow: 180°; Solder_pin_length_mm: 3.2 mm; Contact_material: Cu-Leg; Contact_surface: tinned; Insulating_material: PA GF; UL_94_flammability_rating: V-0; Rated_voltage_for_surge_voltage_class_pollution_degree_II_2: 320 V; Rated_voltage_use_group_B_UL_1059: 300 V; Rated_current_use_group_B_UL_1059: 10 A; PackageReference: SCDV_3_81_180F_06; Colour: Orange; Packaging: Box; Qty: 50 PCS; Revision: V1; ComponentLink1Description: Manufacturer URL; ComponentLink1URL: http://www.weidmueller.com/; ComponentLink2Description: URL Link1; ComponentLink2URL: http://catalog.weidmueller.com/catalog/Start.do?localeId=en&ObjectID=1034990000
footprint SCDV_3_81_180F_06 (OMNIMATE Signal - Serie BC/SC 3.81  SCDV 3.81/06/180F 3.2)
part A pins: A1
part B pins: A2
part C pins: A3
part D pins: B1
part E pins: B2
part F pins: B3

## 1035010000
designator J?
OMNIMATE Signal - series BC/SC 3.81; PartNumber: 1035010000; Manufacturer: Weidmueller; Short_text_for_material: SCDV 3.81/08/180F 3.2SN OR BX; Side_termination_characteristic: Flange; Mounting_onto_the_PCB: Solder connection; Pitch_mm: 3.81 mm; Pitch_inch: 0.15 inch; No_of_poles: 8; Outgoing_elbow: 180°; Solder_pin_length_mm: 3.2 mm; Contact_material: Cu-Leg; Contact_surface: tinned; Insulating_material: PA GF; UL_94_flammability_rating: V-0; Rated_voltage_for_surge_voltage_class_pollution_degree_II_2: 320 V; Rated_voltage_use_group_B_UL_1059: 300 V; Rated_current_use_group_B_UL_1059: 10 A; PackageReference: SCDV_3_81_180F_08; Colour: Orange; Packaging: Box; Qty: 50 PCS; Revision: V1; ComponentLink1Description: Manufacturer URL; ComponentLink1URL: http://www.weidmueller.com/; ComponentLink2Description: URL Link1; ComponentLink2URL: http://catalog.weidmueller.com/catalog/Start.do?localeId=en&ObjectID=1035010000
footprint SCDV_3_81_180F_08 (OMNIMATE Signal - Serie BC/SC 3.81  SCDV 3.81/08/180F 3.2)
part A pins: A1, A2, A3, A4
part B pins: B1, B2, B3, B4

## 1035010000_Single
designator J?
OMNIMATE Signal - series BC/SC 3.81; PartNumber: 1035010000; Manufacturer: Weidmueller; Short_text_for_material: SCDV 3.81/08/180F 3.2SN OR BX; Side_termination_characteristic: Flange; Mounting_onto_the_PCB: Solder connection; Pitch_mm: 3.81 mm; Pitch_inch: 0.15 inch; No_of_poles: 8; Outgoing_elbow: 180°; Solder_pin_length_mm: 3.2 mm; Contact_material: Cu-Leg; Contact_surface: tinned; Insulating_material: PA GF; UL_94_flammability_rating: V-0; Rated_voltage_for_surge_voltage_class_pollution_degree_II_2: 320 V; Rated_voltage_use_group_B_UL_1059: 300 V; Rated_current_use_group_B_UL_1059: 10 A; PackageReference: SCDV_3_81_180F_08; Colour: Orange; Packaging: Box; Qty: 50 PCS; Revision: V1; ComponentLink1Description: Manufacturer URL; ComponentLink1URL: http://www.weidmueller.com/; ComponentLink2Description: URL Link1; ComponentLink2URL: http://catalog.weidmueller.com/catalog/Start.do?localeId=en&ObjectID=1035010000
footprint SCDV_3_81_180F_08 (OMNIMATE Signal - Serie BC/SC 3.81  SCDV 3.81/08/180F 3.2)
part A pins: A1
part B pins: A2
part C pins: A3
part D pins: A4
part E pins: B1
part F pins: B2
part G pins: B3
part H pins: B4

## 1035050000
designator J?
OMNIMATE Signal - series BC/SC 3.81; PartNumber: 1035050000; Manufacturer: Weidmueller; Short_text_for_material: SCDV 3.81/16/180F 3.2SN OR BX; Side_termination_characteristic: Flange; Mounting_onto_the_PCB: Solder connection; Pitch_mm: 3.81 mm; Pitch_inch: 0.15 inch; No_of_poles: 16; Outgoing_elbow: 180°; Solder_pin_length_mm: 3.2 mm; Contact_material: Cu-Leg; Contact_surface: tinned; Insulating_material: PA GF; UL_94_flammability_rating: V-0; Rated_voltage_for_surge_voltage_class_pollution_degree_II_2: 320 V; Rated_voltage_use_group_B_UL_1059: 300 V; Rated_current_use_group_B_UL_1059: 10 A; PackageReference: SCDV_3_81_180F_16; Colour: Orange; Packaging: Box; Qty: 50 PCS; Revision: V1; ComponentLink1Description: Manufacturer URL; ComponentLink1URL: http://www.weidmueller.com/; ComponentLink2Description: URL Link1; ComponentLink2URL: http://catalog.weidmueller.com/catalog/Start.do?localeId=en&ObjectID=1035050000
footprint SCDV_3_81_180F_16 (OMNIMATE Signal - Serie BC/SC 3.81  SCDV 3.81/16/180F 3.2)
part A pins: A1, A2, A3, A4, A5, A6, A7, A8
part B pins: B1, B2, B3, B4, B5, B6, B7, B8

## 1035050000_Single
designator J?
OMNIMATE Signal - series BC/SC 3.81; PartNumber: 1035050000; Manufacturer: Weidmueller; Short_text_for_material: SCDV 3.81/16/180F 3.2SN OR BX; Side_termination_characteristic: Flange; Mounting_onto_the_PCB: Solder connection; Pitch_mm: 3.81 mm; Pitch_inch: 0.15 inch; No_of_poles: 16; Outgoing_elbow: 180°; Solder_pin_length_mm: 3.2 mm; Contact_material: Cu-Leg; Contact_surface: tinned; Insulating_material: PA GF; UL_94_flammability_rating: V-0; Rated_voltage_for_surge_voltage_class_pollution_degree_II_2: 320 V; Rated_voltage_use_group_B_UL_1059: 300 V; Rated_current_use_group_B_UL_1059: 10 A; PackageReference: SCDV_3_81_180F_16; Colour: Orange; Packaging: Box; Qty: 50 PCS; Revision: V1; ComponentLink1Description: Manufacturer URL; ComponentLink1URL: http://www.weidmueller.com/; ComponentLink2Description: URL Link1; ComponentLink2URL: http://catalog.weidmueller.com/catalog/Start.do?localeId=en&ObjectID=1035050000
footprint SCDV_3_81_180F_16 (OMNIMATE Signal - Serie BC/SC 3.81  SCDV 3.81/16/180F 3.2)
part A pins: A1
part B pins: A2
part C pins: A3
part D pins: A4
part E pins: A5
part F pins: A6
part G pins: A7
part H pins: A8
part I pins: B1
part J pins: B2
part K pins: B3
part L pins: B4
part M pins: B5
part N pins: B6
part O pins: B7
part P pins: B8

## 1035310000
designator J?
OMNIMATE Signal - series BC/SC 3.81; PartNumber: 1035310000; Manufacturer: Weidmueller; Short_text_for_material: SCDV 3.81/04/180F 3.2SN BK BX; Side_termination_characteristic: Flange; Mounting_onto_the_PCB: Solder connection; Pitch_mm: 3.81 mm; Pitch_inch: 0.15 inch; No_of_poles: 4; Outgoing_elbow: 180°; Solder_pin_length_mm: 3.2 mm; Contact_surface: tinned; Insulating_material: PA GF; UL_94_flammability_rating: V-0; Rated_voltage_for_surge_voltage_class_pollution_degree_II_2: 320 V; Rated_current_min_no_of_poles_TU_20_deg_C: 17.5 A; Rated_voltage_use_group_B_UL_1059: 300 V; Rated_current_use_group_B_UL_1059: 10 A; PackageReference: SCDV_3_81_180F_04; Colour: Black; Packaging: Box; Qty: 50 PCS; Revision: V1; ComponentLink1Description: Manufacturer URL; ComponentLink1URL: http://www.weidmueller.com/; ComponentLink2Description: URL Link1; ComponentLink2URL: http://catalog.weidmueller.com/catalog/Start.do?localeId=en&ObjectID=1035310000
footprint SCDV_3_81_180F_04 (OMNIMATE Signal - Serie BC/SC 3.81  SCDV 3.81/04/180F 3.2)
part A pins: A1, A2
part B pins: B1, B2
